# Altium footprint library PcbLibLafe.PcbLib: 297 footprints (part 11 of 19)
Each footprint in its own frame and in the unit in brackets; x right, y up, seen from the top. Pads: shape width x height; smd on the part's side, far side on the other; paste and mask are expansions set on the pad; w line width, h text height; cw(c..) or ccw(c..) is an arc to the next point about the centre after c.
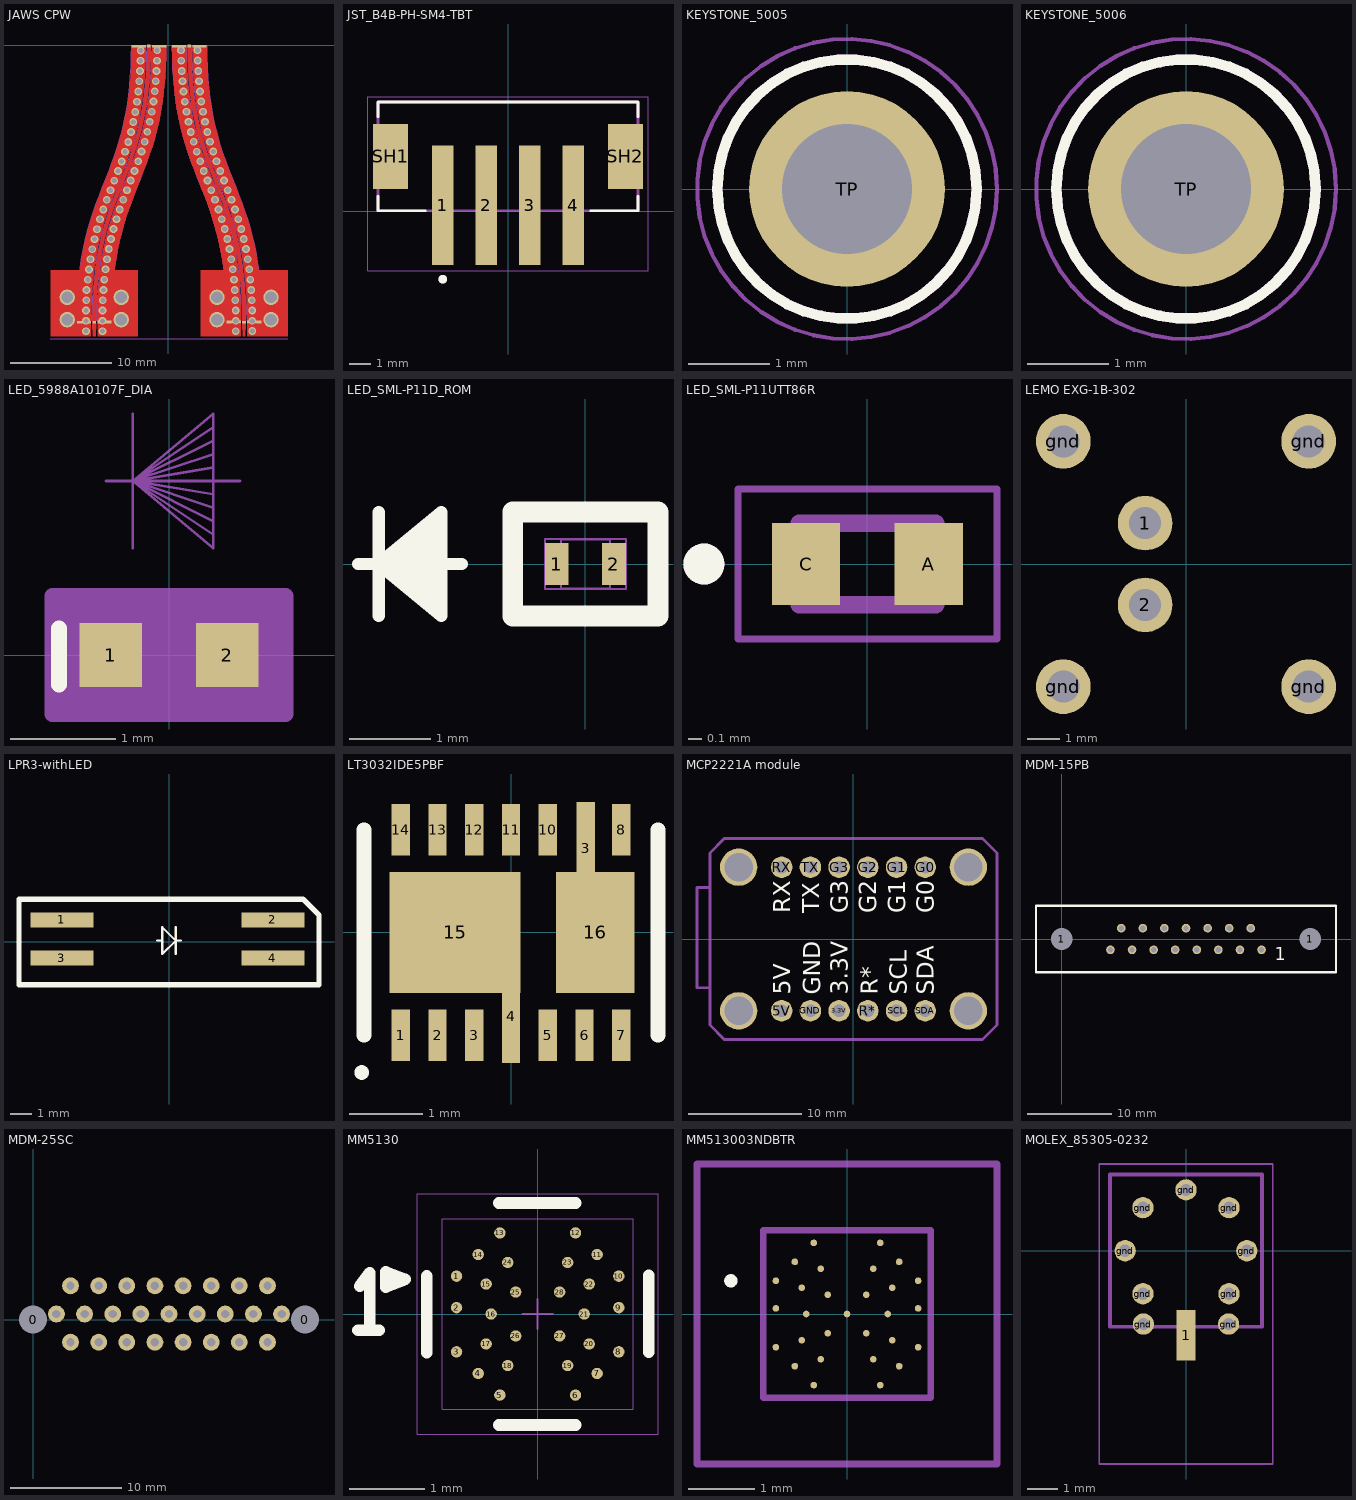
[diagram p10: the footprints below, top view; thin cyan lines are the x and y axes]

## JAWS CPW [mil]
pads (20):
  rect 55.5x10 smd paste+0 mask+0: 19(-327.75,-1075.5)
  rect 14x10 smd: 19(-288,-1075.5)
  rect 55.5x10 smd mask+0: 19(-248.25,-1075) 19(-115.25,-3) 19(-35.75,-3) 19(41.75,-3) 19(121.25,-3) 19(254.25,-1075) 19(333.75,-1075)
  rect 14x10 smd mask+0: 19(-75.5,-2.5) 19(81.5,-2.5) 19(294,-1075.5)
  round 60 hole 45 paste-99999 mask+0: SMA1-1(-393,-979) SMA1-1(189,-979) SMA1-2(-183,-979) SMA1-2(399,-979) SMA1-3(-393,-1066) SMA1-3(189,-1066) SMA1-4(-183,-1066) SMA1-4(399,-1066)
via 113.5,-19.25 diameter 30 hole 20
via 116.25,-99.25 diameter 30 hole 20
via 50.25,-59.25 diameter 30 hole 20
via 114.5,-59 diameter 30 hole 20
via 49.5,-19.25 diameter 30 hole 20
via -43.5,-19.25 diameter 30 hole 20
via -52.75,-178.75 diameter 30 hole 20
via -49,-139 diameter 30 hole 20
via -46.25,-99.25 diameter 30 hole 20
via -44.5,-59.25 diameter 30 hole 20
via -107.5,-19.75 diameter 30 hole 20
via -108.5,-59.75 diameter 30 hole 20
via -110.25,-99.75 diameter 30 hole 20
via -113,-139.5 diameter 30 hole 20
via -117,-179.5 diameter 30 hole 20
via 293,-752.5 diameter 30 hole 20
via 318.75,-910.25 diameter 30 hole 20
via 254.75,-910.25 diameter 30 hole 20
via 314.25,-870.5 diameter 30 hole 20
via 308.5,-831 diameter 30 hole 20
via 301.5,-791.5 diameter 30 hole 20
via 219,-713.75 diameter 30 hole 20
via 250.25,-870.5 diameter 30 hole 20
via 244.5,-831 diameter 30 hole 20
via 237.25,-791.5 diameter 30 hole 20
via 229,-752.5 diameter 30 hole 20
via 283,-713.75 diameter 30 hole 20
via 271.5,-675.25 diameter 30 hole 20
via 207.5,-675.25 diameter 30 hole 20
via 195,-637.5 diameter 30 hole 20
via 259,-637.5 diameter 30 hole 20
via 245.25,-599.75 diameter 30 hole 20
via 181.25,-599.75 diameter 30 hole 20
via 258,-950.5 diameter 30 hole 20
via 166.75,-562.5 diameter 30 hole 20
via 152,-525.25 diameter 30 hole 20
via 230.75,-562.5 diameter 30 hole 20
via 216.25,-525.25 diameter 30 hole 20
via 201.5,-488.25 diameter 30 hole 20
via 137.5,-488.25 diameter 30 hole 20
via 123.5,-450.5 diameter 30 hole 20
via 187.5,-450.5 diameter 30 hole 20
via 174.25,-412.75 diameter 30 hole 20
via 110.25,-413 diameter 30 hole 20
via 98.25,-374.75 diameter 30 hole 20
via 162,-374.75 diameter 30 hole 20
via 151.5,-336.25 diameter 30 hole 20
via 134.5,-258 diameter 30 hole 20
via 87.5,-336.25 diameter 30 hole 20
via 78.25,-297.25 diameter 30 hole 20
via 142.25,-297.25 diameter 30 hole 20
via 70.5,-258 diameter 30 hole 20
via 64,-218.75 diameter 30 hole 20
via 128,-218.5 diameter 30 hole 20
via 122.75,-179 diameter 30 hole 20
via 58.75,-179 diameter 30 hole 20
via 55,-139 diameter 30 hole 20
via 119,-139 diameter 30 hole 20
via 52.25,-99.25 diameter 30 hole 20
via -201.5,-675.25 diameter 30 hole 20
via -231.25,-791.5 diameter 30 hole 20
via -223,-752.5 diameter 30 hole 20
via -213,-713.75 diameter 30 hole 20
via -265.5,-675.75 diameter 30 hole 20
via -277,-714.25 diameter 30 hole 20
via -287,-753 diameter 30 hole 20
via -295.5,-792 diameter 30 hole 20
via -58,-218.5 diameter 30 hole 20
via -81.5,-336 diameter 30 hole 20
via -72.25,-297.25 diameter 30 hole 20
via -64.5,-258 diameter 30 hole 20
via -122,-219 diameter 30 hole 20
via -128.5,-258.5 diameter 30 hole 20
via -136.25,-297.75 diameter 30 hole 20
via -145.5,-336.75 diameter 30 hole 20
via -189,-637.5 diameter 30 hole 20
via -146,-525.25 diameter 30 hole 20
via -175.25,-599.75 diameter 30 hole 20
via -161,-562.5 diameter 30 hole 20
via -131.5,-488.25 diameter 30 hole 20
via -117.5,-450.75 diameter 30 hole 20
via -104.25,-412.75 diameter 30 hole 20
via -92.25,-374.75 diameter 30 hole 20
via -156.25,-375.25 diameter 30 hole 20
via -168.25,-413.25 diameter 30 hole 20
via -181.5,-451.25 diameter 30 hole 20
via -195.5,-488.5 diameter 30 hole 20
via -210,-525.75 diameter 30 hole 20
via -224.75,-563 diameter 30 hole 20
via -239.25,-600.25 diameter 30 hole 20
via -253,-638 diameter 30 hole 20
via -238.5,-831 diameter 30 hole 20
via -248.75,-910.25 diameter 30 hole 20
via -244.25,-870.5 diameter 30 hole 20
via -302.5,-831.25 diameter 30 hole 20
via -308.25,-871 diameter 30 hole 20
via -312.75,-910.75 diameter 30 hole 20
via -256,-1110.5 diameter 30 hole 20
via -320,-1110.5 diameter 30 hole 20
via -320,-1070.5 diameter 30 hole 20
via -318.5,-990.5 diameter 30 hole 20
via -320,-1030.5 diameter 30 hole 20
via -318,-950.5 diameter 30 hole 20
via -256,-1070.5 diameter 30 hole 20
via -256,-1030.5 diameter 30 hole 20
via -254.5,-990.5 diameter 30 hole 20
via -252,-950.5 diameter 30 hole 20
via 262,-1110.5 diameter 30 hole 20
via 326,-1110 diameter 30 hole 20
via 322,-950.5 diameter 30 hole 20
via 324.5,-990.5 diameter 30 hole 20
via 325.5,-1030.5 diameter 30 hole 20
via 326,-1070.5 diameter 30 hole 20
via 261.5,-1030.5 diameter 30 hole 20
via 260,-990.5 diameter 30 hole 20
via 262,-1070.5 diameter 30 hole 20
Top Layer:
  rectangle: 306,-1130.5 361.5,-1080
  rectangle: 226.5,-1130.5 282,-1080
  rectangle: -355.5,-1130.5 -300,-1069.15
  rectangle: -276,-1130.5 -220.5,-1065.5
  region: 69.52,-5 69.98,-44.67 71.55,-87.75 71.55,-87.76 74.07,-128.41 77.5,-166.79 80.47,-192 25.08,-192 22.11,-166.78 18.68,-128.4 16.15,-87.75 14.59,-44.67 14.12,-5
  region: -65.68,-143 -13.98,-143 -13.67,-139.32 -15.28,-158.51 -19.12,-193.26 -23.67,-226.23 -28.86,-257.57 -32.22,-274.5 -87.61,-274.5 -84.26,-257.59 -79.06,-226.25 -74.51,-193.27 -70.67,-158.52 -69.06,-139.32
  region: -8.09,-2.61 -8.53,-42.22 -9.93,-83.13 -12.2,-121.84 -13.98,-143 -65.68,-143 -69.06,-139.32 -67.59,-121.85 -65.32,-83.13 -63.92,-42.23 -63.45,0.95 -11.61,0.95
  region: 88.93,-45.17 88.93,-45.18 90.49,-88.26 93.02,-128.91 96.45,-167.29 96.45,-167.3 100.71,-203.57 105.75,-237.9 112.59,-276.08 112.6,-276.08 120.32,-312.04 128.82,-346.05 137.98,-378.37 149.63,-415.01 161.89,-450.07 161.9,-450.07 174.61,-484 187.6,-517.25 200.68,-550.25 213.68,-583.47 224.63,-612.43 235.27,-642.15 245.5,-672.92 255.21,-704.99 264.28,-738.67 272.61,-774.23 280.08,-811.94 285.28,-843.27 289.83,-876.25 293.67,-911 296.75,-947.66 299.01,-986.38 300.41,-1027.28 300.85,-1066.84 297.34,-1070.39 287.11,-1070.39 286.63,-1027.27 285.23,-986.37 282.96,-947.65 279.88,-910.98 279.88,-910.97 276.04,-876.22 271.49,-843.24 266.3,-811.91 266.3,-811.9 258.82,-774.18 250.49,-738.62 241.42,-704.94 241.42,-704.93 231.71,-672.85 221.48,-642.08 221.47,-642.08 210.83,-612.36 199.88,-583.39 186.88,-550.18 173.8,-517.17 160.81,-483.92 148.1,-450 135.83,-414.94 124.19,-378.31 115.03,-345.99 106.53,-311.99 98.81,-276.04 91.97,-237.87 86.93,-203.54 82.66,-167.27 79.24,-128.89 76.71,-88.25 75.14,-45.17 74.65,-3.16 78.17,0.39 88.39,0.39
  region: 189.37,-345.53 189.37,-345.54 198.54,-377.85 210.18,-414.49 222.45,-449.55 235.16,-483.48 248.15,-516.73 252.81,-528.48 197.42,-528.48 192.75,-516.69 179.76,-483.44 167.05,-449.52 154.78,-414.46 143.18,-377.95 185.25,-377.95 185.25,-329.05 184.79,-327.23
  region: 161.27,-203.06 166.31,-237.39 173.15,-275.57 180.87,-311.53 185.25,-329.05 185.25,-377.95 143.18,-377.95 143.14,-377.82 133.97,-345.51 125.48,-311.5 117.75,-275.55 110.91,-237.37 105.88,-203.05 104.58,-192 159.97,-192 158.17,-176.7
  region: 149.02,-5 149.48,-44.67 151.05,-87.75 151.05,-87.76 153.57,-128.41 157,-166.79 159.97,-192 104.58,-192 101.61,-166.78 98.18,-128.4 95.65,-87.75 94.09,-44.67 93.62,-5
  region: 81.77,-203.06 86.81,-237.39 93.65,-275.57 101.37,-311.53 109.87,-345.53 109.87,-345.54 119.04,-377.85 119.07,-377.95 63.68,-377.95 63.64,-377.82 54.47,-345.51 45.98,-311.5 38.25,-275.55 31.41,-237.37 26.38,-203.05 25.08,-192 80.47,-192 78.67,-176.7
  region: -68.65,-3.16 -69.09,-42.72 -70.49,-83.62 -72.75,-122.34 -75.83,-159 -79.67,-193.75 -84.22,-226.73 -89.42,-258.06 -96.89,-295.77 -105.22,-331.33 -114.29,-365.01 -124,-397.08 -134.23,-427.85 -144.87,-457.57 -155.82,-486.53 -168.82,-519.75 -181.9,-552.75 -194.89,-586 -207.6,-619.93 -207.61,-619.93 -219.87,-654.99 -231.52,-691.63 -240.68,-723.95 -249.18,-757.96 -256.9,-793.92 -263.75,-832.1 -268.79,-866.43 -273.05,-902.7 -273.05,-902.71 -276.48,-941.09 -279.01,-981.74 -280.57,-1024.82 -280.57,-1024.83 -281.11,-1070.39 -291.33,-1070.39 -294.85,-1066.84 -294.36,-1024.83 -292.79,-981.75 -290.26,-941.11 -286.84,-902.73 -282.57,-866.46 -277.53,-832.13 -270.69,-793.96 -262.97,-758.01 -254.47,-724.01 -245.31,-691.69 -233.67,-655.06 -221.4,-620 -208.69,-586.08 -195.7,-552.83 -182.62,-519.82 -169.62,-486.61 -158.67,-457.64 -148.03,-427.92 -148.02,-427.92 -137.79,-397.15 -128.08,-365.07 -128.08,-365.06 -119.01,-331.38 -110.68,-295.82 -103.2,-258.1 -103.2,-258.09 -98.01,-226.76 -93.46,-193.78 -89.62,-159.03 -89.62,-159.02 -86.54,-122.35 -84.27,-83.63 -82.87,-42.73 -82.39,0.39 -72.16,0.39
  region: -115.84,-295.78 -124.16,-331.34 -133.24,-365.02 -142.95,-397.1 -153.18,-427.86 -163.82,-457.59 -174.77,-486.55 -177.54,-493.63 -232.92,-493.63 -230.17,-486.59 -219.22,-457.63 -219.22,-457.62 -208.58,-427.9 -198.34,-397.14 -198.34,-397.13 -188.63,-365.05 -179.56,-331.37 -171.23,-295.81 -167.01,-274.5 -111.62,-274.5 -111,-271.38
  region: -91.7,-122.34 -94.78,-159.01 -98.62,-193.76 -103.17,-226.73 -108.36,-258.07 -111.62,-274.5 -167.01,-274.5 -163.76,-258.09 -158.56,-226.75 -154.01,-193.77 -150.17,-159.02 -148.52,-139.32 -145.13,-143 -93.44,-143 -91.7,-122.34 -91.04,-111
  region: -87.59,-3.11 -88.03,-42.72 -89.43,-83.63 -91.7,-122.34 -93.44,-143 -145.13,-143 -148.52,-139.32 -147.09,-122.35 -144.82,-83.63 -143.42,-42.73 -142.95,0.45 -91.11,0.45
  region: 130.68,-414.49 142.95,-449.55 155.66,-483.48 168.65,-516.73 173.31,-528.48 117.92,-528.48 113.25,-516.69 100.26,-483.44 87.55,-449.52 75.28,-414.46 63.68,-377.95 119.07,-377.95
  region: -36.34,-295.28 -44.66,-330.84 -53.74,-364.52 -63.45,-396.6 -73.68,-427.36 -84.32,-457.09 -95.27,-486.05 -98.23,-493.63 -153.62,-493.63 -150.67,-486.09 -139.72,-457.13 -139.72,-457.12 -129.08,-427.4 -118.84,-396.64 -118.84,-396.63 -109.13,-364.55 -100.06,-330.87 -91.73,-295.31 -87.61,-274.5 -86.99,-271.38 -87.61,-274.5 -32.22,-274.5 -31.6,-271.38
  region: 324.84,-738.16 333.16,-773.72 340.64,-811.43 345.83,-842.77 350.38,-875.74 354.22,-910.49 357.3,-947.16 359.57,-985.87 360.97,-1026.78 361.45,-1069.95 306.05,-1069.95 305.58,-1026.77 304.18,-985.87 301.91,-947.15 298.83,-910.48 294.99,-875.73 290.44,-842.75 285.24,-811.41 277.77,-773.69 269.44,-738.13 265.96,-725.23 321.35,-725.23
  region: 245.34,-738.16 253.66,-773.72 261.14,-811.43 266.33,-842.77 270.88,-875.74 274.72,-910.49 277.8,-947.16 280.07,-985.87 281.47,-1026.78 281.95,-1069.95 226.55,-1069.95 226.08,-1026.77 224.68,-985.87 222.41,-947.15 219.33,-910.48 215.49,-875.73 210.94,-842.75 205.74,-811.41 198.27,-773.69 189.94,-738.13 186.46,-725.23 241.85,-725.23
  region: 261.23,-549.74 274.23,-582.95 285.18,-611.91 295.82,-641.64 306.05,-672.4 315.76,-704.48 321.35,-725.23 265.96,-725.23 260.37,-704.45 250.66,-672.37 250.66,-672.36 240.42,-641.6 229.78,-611.88 229.78,-611.87 218.83,-582.91 205.83,-549.7 197.42,-528.48 252.81,-528.48 251.02,-523.98
  region: 181.73,-549.74 194.73,-582.95 205.68,-611.91 216.32,-641.64 226.55,-672.4 236.26,-704.48 241.85,-725.23 186.46,-725.23 180.87,-704.45 171.16,-672.37 171.16,-672.36 160.92,-641.6 150.28,-611.88 150.28,-611.87 139.33,-582.91 126.33,-549.7 118,-528.68 118.01,-528.48 173.31,-528.48
  region: 125.34,-874.75 242.49,-874.75 242.44,-1130.5 125.34,-1130.5
  region: -180.13,-723.46 -180.13,-723.47 -188.63,-757.47 -196.35,-793.43 -203.19,-831.61 -208.23,-865.94 -212.5,-902.21 -215.05,-930.82 -270.44,-930.82 -267.89,-902.22 -263.62,-865.95 -258.59,-831.63 -251.75,-793.45 -244.02,-757.5 -235.53,-723.49 -231.29,-708.57 -232.1,-711.4 -176.71,-711.4 -175.91,-708.57
  region: -259.63,-723.96 -259.63,-723.97 -268.13,-757.97 -275.85,-793.93 -282.69,-832.11 -287.73,-866.44 -292,-902.71 -294.51,-930.82 -349.9,-930.82 -347.39,-902.72 -343.12,-866.45 -338.09,-832.13 -331.25,-793.95 -323.52,-758 -315.03,-723.99 -310.65,-708.57 -311.45,-711.4 -256.07,-711.4 -255.27,-708.57
  region: -108.27,-519.26 -121.35,-552.27 -134.34,-585.52 -147.05,-619.45 -159.32,-654.51 -170.96,-691.15 -176.71,-711.4 -232.1,-711.4 -226.36,-691.18 -214.72,-654.54 -202.45,-619.48 -189.74,-585.56 -176.75,-552.31 -163.67,-519.3 -153.62,-493.63 -98.23,-493.63 -97.12,-490.78
  region: -187.77,-519.76 -200.85,-552.77 -213.84,-586.02 -226.55,-619.95 -238.82,-655.01 -250.46,-691.65 -256.07,-711.4 -311.45,-711.4 -305.86,-691.68 -294.22,-655.04 -281.95,-619.98 -269.24,-586.06 -256.25,-552.81 -243.17,-519.8 -232.92,-493.63 -177.54,-493.63
  region: 345.99,-874.75 463.14,-874.75 463.14,-1130.5 345.94,-1130.5
  region: 301,-1080.5 299.48,-1130.5 288.52,-1130.5 287,-1080.5
  region: -215.93,-940.59 -218.45,-981.24 -218.45,-981.25 -220.02,-1024.33 -220.55,-1069.95 -272.39,-1069.95 -275.9,-1066.39 -275.41,-1024.33 -273.85,-981.25 -271.32,-940.6 -270.44,-930.82 -215.05,-930.82 -212.5,-902.21
  region: -295.43,-941.09 -297.95,-981.74 -297.95,-981.75 -299.52,-1024.83 -299.59,-1030.96 -300.05,-1070.45 -351.89,-1070.45 -355.4,-1066.89 -354.91,-1024.83 -353.35,-981.75 -350.82,-941.1 -349.9,-930.82 -294.51,-930.82 -292,-902.71
  region: -282.5,-1130.5 -293.5,-1130.5 -295,-1080.5 -281,-1080.5
  region: -456.66,-874.75 -339.51,-874.75 -339.56,-1130.5 -456.66,-1130.5
  region: -236.01,-874.75 -118.86,-874.75 -118.86,-1130.5 -236.06,-1130.5
  lines w1: -354.91,-1074.2 -354.91,-1066.05 ; -354.37,-1074.36 -354.37,-1066.21 ; -353.55,-1074.43 -353.55,-1066.28 ; -353.01,-1074.5 -353.01,-1066.35 ; -352.18,-1074.71 -352.18,-1066.56 ; -294.4,-1071.58 -294.4,-1066.77 ; -293.5,-1077 -292.57,-1083.35 -293.16,-1075.9 ; -293.47,-1067.05 -293.47,-1071.86 -293.16,-1075.9 ; -292.85,-1072.03 -292.85,-1067.22 ; -292.2,-1072.31 -292.2,-1067.49 ; -291.44,-1072.62 -291.44,-1067.8 ; -291.03,-1072.89 -291.03,-1070.59 ; -291.03,-1068.08 -291.03,-1070.59 ; -281.51,-1070.52 -288.04,-1070.57 -291.03,-1070.59 ; 287.57,-1070.47 294,-1070.46 ; 297.33,-1072.35 297.33,-1070.46 ; 297.33,-1067.54 297.33,-1070.46 ; 297.52,-1070.46 297.33,-1070.46 ; 297.81,-1071.97 297.81,-1067.15 ; 298.37,-1071.75 298.37,-1066.94 ; 299.04,-1071.64 299.04,-1066.83 ; 299.64,-1071.53 299.64,-1066.72 ; 300.34,-1071.46 300.34,-1066.64 ; -293.16,-1075.9 -293.16,-1075.9 ; -291.06,-1070.59 -291.03,-1070.59 ; 294,-1070.46 294,-1070.46 ; 294,-1070.46 297.33,-1070.46
Mid-Layer 1:
  rectangle: -458.12,-1130.5 -119,-873.72
  rectangle: 124,-1130.5 463.12,-874.72
  region: 149.05,-3.5 14.05,-3.5 14.08,-6 14.11,-9 14.22,-19 14.48,-42.23 15.02,-58 15.88,-83.13 17.28,-107 18.15,-121.85 19.17,-134 20.18,-146 21.23,-158.51 22.39,-169 23.5,-179 25.07,-193.27 27.37,-210 28.61,-219 29.61,-226.24 30.57,-232 31.4,-237 32.39,-243 34.81,-257.58 37.07,-269 40.5,-286.3 42.28,-295.3 44.5,-304.76 48.77,-323 50.61,-330.86 52.5,-337.87 54.5,-345 56.85,-354 59.69,-364.54 69.4,-396.62 73.85,-410 79.63,-427.38 82.71,-436 87.01,-448 90.27,-457.11 94.39,-468 99.68,-482 105.1,-496 120.76,-535.79 126,-549 135.39,-573 140.29,-585.54 144.96,-598 153,-619.47 164.74,-653 170.5,-671 175.27,-686 176.91,-691.16 179.14,-699 180.27,-703 183.11,-713 186.08,-723.48 188.46,-733 193.96,-755 196.19,-765 199.2,-779 202.3,-793.44 204.5,-805.73 205.27,-810 207.06,-820 209.14,-831.62 212.13,-852 214.18,-865.94 215.13,-874 217.5,-894.19 219.05,-909 221.5,-936.43 221.87,-940.6 222.33,-948 223.02,-959 223.76,-971 224.4,-981.25 224.65,-988 225.5,-1011.53 226.04,-1031 226.18,-1043 226.43,-1064 226.5,-1070 361.5,-1070 361.37,-1059 361.15,-1040 360.81,-1020 360.01,-998 359.4,-981.25 358.83,-972 358.14,-961 356.87,-940.6 355.21,-922 353.87,-907 351.42,-885 349.18,-865.94 344.14,-831.62 340.5,-811.31 337.3,-793.44 335.27,-784 333.12,-774 329.58,-757.48 326.96,-747 321.08,-723.48 318.5,-714.38 317.26,-710 311.91,-691.16 309.5,-683.57 306.14,-673 300.27,-654.53 292.5,-632.32 288,-619.47 281.83,-603 275.29,-585.54 266.09,-562 249.22,-519.28 236.22,-486.07 228.63,-466 222.73,-450 214.63,-427.38 207.5,-406 204.4,-396.62 199.06,-379 194.69,-364.54 185.61,-330.86 177.68,-297 169.81,-257.58 164.61,-226.24 160.07,-193.27 156.23,-158.51 155.01,-144 153.15,-121.85 151.98,-102 150.57,-74 149.48,-42.23
  region: -142.94,-3 -7.94,-3 -8.08,-15 -8.11,-18 -8.22,-28 -8.48,-51.23 -9.02,-67 -9.88,-92.13 -11.28,-116 -12.15,-130.85 -13.17,-143 -14.18,-155 -15.23,-167.51 -16.39,-178 -17.5,-188 -19.07,-202.27 -21.37,-219 -22.61,-228 -23.61,-235.24 -24.57,-241 -25.4,-246 -26.39,-252 -28.81,-266.58 -31.07,-278 -34.5,-295.3 -36.28,-304.3 -38.5,-313.76 -42.77,-332 -44.61,-339.86 -46.5,-346.87 -48.5,-354 -50.85,-363 -53.69,-373.54 -63.4,-405.62 -67.85,-419 -73.63,-436.38 -76.71,-445 -81.01,-457 -84.27,-466.11 -88.39,-477 -93.68,-491 -99.1,-505 -114.76,-544.79 -120,-558 -129.39,-582 -134.29,-594.54 -138.96,-607 -147,-628.47 -158.74,-662 -164.5,-680 -169.27,-695 -170.91,-700.16 -173.14,-708 -174.27,-712 -177.11,-722 -180.08,-732.48 -182.46,-742 -187.96,-764 -190.19,-774 -193.2,-788 -196.3,-802.44 -198.5,-814.73 -199.27,-819 -201.06,-829 -203.14,-840.62 -206.13,-861 -208.18,-874.94 -209.13,-883 -211.5,-903.19 -213.05,-918 -215.5,-945.43 -215.87,-949.6 -216.33,-957 -217.02,-968 -217.76,-980 -218.4,-990.25 -218.65,-997 -219.5,-1020.53 -220.04,-1040 -220.18,-1052 -220.43,-1073 -220.5,-1079 -355.5,-1079 -355.37,-1068 -355.15,-1049 -354.81,-1029 -354.01,-1007 -353.4,-990.25 -352.83,-981 -352.14,-970 -350.87,-949.6 -349.21,-931 -347.87,-916 -345.42,-894 -343.18,-874.94 -338.14,-840.62 -334.5,-820.31 -331.3,-802.44 -329.27,-793 -327.12,-783 -323.58,-766.48 -320.96,-756 -315.08,-732.48 -312.5,-723.38 -311.26,-719 -305.91,-700.16 -303.5,-692.57 -300.14,-682 -294.27,-663.53 -286.5,-641.32 -282,-628.47 -275.83,-612 -269.29,-594.54 -260.09,-571 -243.22,-528.28 -230.22,-495.07 -222.63,-475 -216.73,-459 -208.63,-436.38 -201.5,-415 -198.4,-405.62 -193.06,-388 -188.69,-373.54 -179.61,-339.86 -171.68,-306 -163.81,-266.58 -158.61,-235.24 -154.07,-202.27 -150.23,-167.51 -149.01,-153 -147.15,-130.85 -145.98,-111 -144.57,-83 -143.48,-51.23
Top Solder:
  drawing of 134 lines, arcs and shapes, not listed
Mechanical 2:
  lines w1: -458,-1141 463,-1141
Mechanical 3:
  drawing of 240 lines, arcs and shapes, not listed
Mechanical 4:
  drawing of 278 lines, arcs and shapes, not listed

## JST_B4B-PH-SM4-TBT [mm]
height 6.6
pads (6):
  rect 1x5.5 smd: 1(-3,0.265) 2(-1,0.265) 3(1,0.265) 4(3,0.265)
  rect 1.6x3 smd: SH1(-5.4,2.515) SH2(5.4,2.515)
Top Overlay:
  circle w0.2: c-3,-3.135 r0.1
  lines w0.127: -5.975,0.695 -5.975,0.015 -3.82,0.015 ; -5.975,4.335 -5.975,5.015 5.975,5.015 5.975,4.335 ; 3.82,0.015 5.975,0.015 5.975,0.695
Mechanical 13:
  circle w0.2: c-3,-3.135 r0.1
  lines w0.127: -5.975,0.015 5.975,0.015 5.975,5.015 -5.975,5.015 -5.975,0.015
Mechanical 15:
  lines w0.05: -6.45,-2.735 -6.45,5.265 6.45,5.265 6.45,-2.735 -6.45,-2.735

## KEYSTONE_5005 [mm]
pads (1):
  round 2.4 hole 1.6: TP(0,0)
Top Overlay:
  circle w0.127: c0,0 r1.59
Mechanical 13:
  circle w0.127: c0,0 r1.59
Mechanical 15:
  circle w0.05: c0,0 r1.84
3D body "step_temp.STEP": height 5.58, standoff -3.3, extent -1.576,-1.587 1.576,1.587

## KEYSTONE_5006 [mm]
pads (1):
  round 2.4 hole 1.6: TP(0,0)
Top Overlay:
  circle w0.127: c0,0 r1.59
Mechanical 13:
  circle w0.127: c0,0 r1.59
Mechanical 15:
  circle w0.05: c0,0 r1.84
3D body "step_temp.STEP": height 5.58, standoff -3.3, extent -1.576,-1.587 1.576,1.587

## LED_5988A10107F_DIA [mil]
pads (2):
  rect 23.5x24 smd paste+0 mask+0: 1(-21.75,0) 2(21.75,0)
Top Overlay:
  lines w6: -41,-11 -41,10
Mechanical 13:
  lines w1: -23.5,65 26.5,65 ; -13.5,40 -13.5,90 ; 16.5,45 -13.5,65 ; 16.5,50 -13.5,65 ; 16.5,55 -13.5,65 ; 16.5,60 -13.5,65 ; 16.5,70 -13.5,65 ; 16.5,75 -13.5,65 ; 16.5,80 -13.5,65 ; 16.5,85 -13.5,65 ; -13.5,65 16.5,40 16.5,90 -13.5,65 ; -19.5,-10 -19.5,10 19.5,10 19.5,-10 -19.5,-10
Mechanical 15:
  region: -29.5,-22 -43.5,-22 -43.5,22 -29.5,22 29.5,22 43.5,22 43.5,-22 29.5,-22
  lines w6: -43.5,-22 -29.5,-22 29.5,-22 43.5,-22 43.5,22 29.5,22 -29.5,22 -43.5,22 -43.5,-22
3D body "LED_5988A10107F_DIA.step": height 16.1, standoff -0.12, extent -19.49,-10.12 19.49,10.12

## LED_SML-P11D_ROM [mil]
pads (2):
  rect 11.5x20 smd paste+0 mask+0: 1(-13.75,0) 2(13.75,0)
Top Overlay:
  lines w6: -109.5,0 -59.5,0 ; -99.5,-25 -99.5,25 ; -69.5,-20 -99.5,0 ; -69.5,-15 -99.5,0 ; -69.5,-10 -99.5,0 ; -69.5,-5 -99.5,0 ; -69.5,5 -99.5,0 ; -69.5,10 -99.5,0 ; -69.5,15 -99.5,0 ; -69.5,20 -99.5,0 ; -99.5,0 -69.5,-25 -69.5,25 -99.5,0
  lines w10: -35,-25 35,-25 35,25 -35,25 -35,-25
Mechanical 13:
  lines w1: -109.5,0 -59.5,0 ; -99.5,-25 -99.5,25 ; -69.5,-20 -99.5,0 ; -69.5,-15 -99.5,0 ; -69.5,-10 -99.5,0 ; -69.5,-5 -99.5,0 ; -69.5,5 -99.5,0 ; -69.5,10 -99.5,0 ; -69.5,15 -99.5,0 ; -69.5,20 -99.5,0 ; -99.5,0 -69.5,-25 -69.5,25 -99.5,0 ; -19.5,-12 -19.5,12 19.5,12 19.5,-12 -19.5,-12 ; -11.81,-11.81 11.81,-11.81 11.81,11.81 -11.81,11.81 -11.81,-11.81
3D body: height 10, standoff 0, extent 0,0 10,10

## LED_SML-P11UTT86R [mm]
pads (2):
  rect 0.5x0.6 smd: A(0.45,0) C(-0.45,0)
Top Overlay:
  circle w0.2: c-1.2,0 r0.05
Mechanical 13:
  circle w0.2: c-1.2,0 r0.05
  lines w0.127: -0.5,-0.3 -0.5,0.3 0.5,0.3 0.5,-0.3 -0.5,-0.3
Mechanical 15:
  lines w0.05: -0.95,-0.55 -0.95,0.55 0.95,0.55 0.95,-0.55 -0.95,-0.55
3D body "step_temp.STEP": height 0.21, standoff -0.04, extent -0.5,-0.3 0.5,0.3

## LEMO EXG-1B-302 [mm] "2 pin LEMO right angle panel mount"
pads (6):
  round 1.7 hole 1: 1(-1.27,1.27) 2(-1.27,-1.27) gnd(-3.81,-3.81) gnd(-3.81,3.81) gnd(3.81,-3.81) gnd(3.81,3.81)

## LPR3-withLED [mil] "Bivar lightpipe integrated LED"
pads (4):
  rect 118x28 smd: 1(-200,41) 2(194,41) 3(-200,-30) 4(194,-30)
Top Overlay:
  lines w4: 12.5,-22.5 12.5,2.5 ; 12.5,27.5 12.5,2.5 ; 22.5,2.5 12.5,2.5 ; -12.5,2.5 -12.5,-22.5 12.5,2.5 ; -12.5,2.5 -22.5,2.5 -12.5,2.5 ; -12.5,2.5 -12.5,27.5 12.5,2.5
  lines w10: -280,-80 280,-80 280,50 250,80 -280,80 -280,-80

## LT3032IDE5PBF [mm]
pads (16):
  rect 0.25x0.7 smd: 1(-1.5,-1.4) 2(-1,-1.4) 3(-0.5,-1.4) 5(0.5,-1.4) 6(1,-1.4) 7(1.5,-1.4) 8(1.5,1.4) 10(0.5,1.4) 11(0,1.4) 12(-0.5,1.4) 13(-1,1.4) 14(-1.5,1.4)
  rect 0.25x1.27 smd: 3(1.016,1.143) 4(0,-1.143)
  rect 1.78x1.65 smd: 15(-0.762,0)
  rect 1.07x1.65 smd: 16(1.145,0)
Top Overlay:
  lines w0.1: -2.032,-1.955 ccw(c-2.032,-1.905) -2.032,-1.855 ccw(c-2.032,-1.905) -2.032,-1.955
  lines w0.2: -2,-1.4 -2,1.4 ; 2,-1.4 2,1.4
3D body "LT3032IDE-5#PBF.stp": height 0.9, standoff 0, extent -2,-1.5 2,1.5

## MCP2221A module [mil] "Adafruit MCP2221A"
pads (16):
  round 75 hole 45: 3.3V(-50,-250) 5V(-250,-250) G0(250,250) G1(150,250) G2(50,250) G3(-50,250) GND(-150,-250) R*(50,-250) RX(-250,250) SCL(150,-250) SDA(250,-250) TX(-150,250)
  round 130 hole 100: ""(-400,-250) ""(-400,250) ""(400,-250) ""(400,250)
Top Overlay:
  text "SDA" at 280,-195 h60
  text "SCL" at 185,-195 h60
  text "R*" at 85,-195 h60
  text "3.3V" at -20,-195 h60
  text "GND" at -115,-195 h60
  text "5V" at -220,-195 h60
  text "G0" at 280,90 h60
  text "G1" at 180,90 h60
  text "G2" at 80,90 h60
  text "G3" at -20,90 h60
  text "TX" at -120,90 h60
  text "RX" at -220,90 h60
Mechanical 2:
  lines w10: -500,-170 -545,-170 -545,180 -500,180 ; -500,-300 -500,300 -450,350 450,350 500,300 500,-300 450,-350 -450,-350 -500,-300

## MDM-15PB [mil] "MicroD-15 pin"
pads (17):
  round 60 hole 100: 1(0,0) 1(1150,0)
  round 40 hole 25: ""(225,-50) ""(275,50) ""(325,-50) ""(375,50) ""(425,-50) ""(475,50) ""(525,-50) ""(575,50) ""(625,-50) ""(675,50) ""(725,-50) ""(775,50) ""(825,-50) ""(875,50) ""(925,-50)
Top Overlay:
  lines w10: -120,-154 1270,-154 1270,154 -120,154 -120,-154
  text "1" at 987,-98 h60

## MDM-25SC [mil] "MicroD 25 pin female socket"
pads (27):
  round 60 hole 100: 0(0,0) 0(966,0)
  round 60 hole 30: ""(83,20) ""(133,-80) ""(133,120) ""(183,20) ""(233,-80) ""(233,120) ""(283,20) ""(333,-80) ""(333,120) ""(383,20) ""(433,-80) ""(433,120) ""(483,20) ""(533,-80) ""(533,120) ""(583,20) ""(633,-80) ""(633,120) ""(683,20) ""(733,-80) ""(733,120) ""(783,20) ""(833,-80) ""(833,120) ""(883,20)

## MM5130 [mm] "Standard MM5130 Footprint"
height 1
pads (28):
  round 0.15 smd paste+0 mask+0.025: 1(-1.072,0.5) 2(-1.072,0.084) 3(-1.072,-0.5) 4(-0.786,-0.786) 5(-0.5,-1.072) 6(0.5,-1.072) 7(0.786,-0.786) 8(1.072,-0.5) 9(1.072,0.084) 10(1.072,0.5) 11(0.786,0.786) 12(0.5,1.072) 13(-0.5,1.072) 14(-0.786,0.786) 15(-0.681,0.396) 16(-0.615,0) 17(-0.681,-0.396) 18(-0.396,-0.681) 19(0.396,-0.681) 20(0.681,-0.396) 21(0.615,0) 22(0.681,0.396) 23(0.396,0.681) 24(-0.396,0.681) 25(-0.29,0.29) 26(-0.29,-0.29) 27(0.29,-0.29) 28(0.29,0.29)
Top Overlay:
  lines w0.152: -2.349,0.368 -2.222,0.546 -2.222,-0.216 -2.375,-0.216 -2.095,-0.216 ; -1.467,-0.514 -1.467,0.502 ; -0.514,-1.467 0.502,-1.467 ; -0.514,1.467 0.502,1.467 ; 1.467,-0.504 1.467,0.512 ; -2.007,0.356 -1.753,0.457 -2.007,0.559 -2.007,0.356
Top Courtyard:
  lines w0.01: -1.59,-1.59 1.59,-1.59 1.59,1.59 -1.59,1.59 -1.59,-1.59
Top Component Center:
  lines w0.025: -0.2,0 0.2,0 ; 0,-0.2 0,0.2
Mechanical 16:
  text "G1" at -1.16,0.162 h0.07
  text "RF1" at -0.881,0.858 h0.07
  text "G2" at -0.709,0.091 h0.07
  text "G3" at 0.764,0.097 h0.07
  text "RF4" at 0.93,0.859 h0.07
  text "G4" at 1.205,0.186 h0.07
  text "RF2" at -0.855,-1.065 h0.07
  text "RFC" at 0.027,-0.303 h0.07
  text "RF3" at 0.954,-1.016 h0.07
Top Component Outline:
  lines w0.01: -1.26,-1.26 1.26,-1.26 1.26,1.26 -1.26,1.26 -1.26,-1.26
3D body "MM5130.STEP": height 0.94, standoff 0, extent -1.26,-1.26 1.26,1.26

## MM513003NDBTR [mm]
pads (29):
  round 0.1 smd: 1(-1.072,0.5) 2(-1.072,0.084) 3(-1.072,-0.5) 4(-0.786,-0.786) 5(-0.5,-1.072) 6(0.5,-1.072) 7(0.786,-0.786) 8(1.072,-0.5) 9(1.072,0.084) 10(1.072,0.5) 11(0.786,0.786) 12(0.5,1.072) 13(-0.5,1.072) 14(-0.786,0.786) 15(-0.681,0.396) 16(-0.615,0) 17(-0.681,-0.396) 18(-0.396,-0.681) 19(0.396,-0.681) 20(0.681,-0.396) 21(0.615,0) 22(0.681,0.396) 23(0.396,0.681) 24(-0.396,0.681) 25(-0.29,0.29) 26(-0.29,-0.29) 27(0.29,-0.29) 28(0.29,0.29) 29(0,0)
Top Overlay:
  lines w0.1: -1.8,0.5 cw(c-1.75,0.5) -1.7,0.5 cw(c-1.75,0.5) -1.8,0.5
Mechanical 15:
  lines w0.1: -1.26,-1.26 -1.26,1.26 1.26,1.26 1.26,-1.26 -1.26,-1.26
Mechanical 20:
  lines w0.1: -2.26,-2.26 -2.26,2.26 2.26,2.26 2.26,-2.26 -2.26,-2.26
3D body "MM5130-03NDB-TR.stp": height 0.94, standoff 0, extent -1.26,-1.26 1.26,1.26

## MOLEX_85305-0232 [mm]
height 4.1
pads (10):
  rect 0.61x1.651 smd: 1(0,-2.775)
  round 0.7 hole 0.4 mask+0: gnd(-2,0) gnd(-1.414,-1.414) gnd(-1.414,1.414) gnd(-1.4,-2.41) gnd(0,2) gnd(1.4,-2.41) gnd(1.414,-1.414) gnd(1.414,1.414) gnd(2,0)
Top Paste:
  region: 2.6,-2.6 0.725,-2.6 0.725,-1.198 0.917,-1.058 1.086,-0.884 1.222,-0.683 1.322,-0.462 1.381,-0.227 1.4,0.015 1.376,0.256 1.312,0.49 1.208,0.708 1.067,0.906 0.895,1.077 0.696,1.215 0.476,1.317 0.242,1.379 0,1.4 -0.242,1.379 -0.476,1.317 -0.696,1.215 -0.895,1.077 -1.067,0.906 -1.208,0.708 -1.312,0.49 -1.376,0.256 -1.4,0.015 -1.381,-0.227 -1.322,-0.462 -1.222,-0.683 -1.086,-0.884 -0.917,-1.058 -0.725,-1.198 -0.725,-2.6 -2.6,-2.6 -2.6,2.6 2.6,2.6
Top Solder:
  region: 2.6,-2.6 0.725,-2.6 0.725,-1.198 0.917,-1.058 1.086,-0.884 1.222,-0.683 1.322,-0.462 1.381,-0.227 1.4,0.015 1.376,0.256 1.312,0.49 1.208,0.708 1.067,0.906 0.895,1.077 0.696,1.215 0.476,1.317 0.242,1.379 0,1.4 -0.242,1.379 -0.476,1.317 -0.696,1.215 -0.895,1.077 -1.067,0.906 -1.208,0.708 -1.312,0.49 -1.376,0.256 -1.4,0.015 -1.381,-0.227 -1.322,-0.462 -1.222,-0.683 -1.086,-0.884 -0.917,-1.058 -0.725,-1.198 -0.725,-2.6 -2.6,-2.6 -2.6,2.6 2.6,2.6
Mechanical 13:
  lines w0.127: -2.5,-2.5 -2.5,2.5 2.5,2.5 2.5,-2.5 -2.5,-2.5
Mechanical 15:
  lines w0.05: -2.85,-7.01 2.85,-7.01 2.85,2.85 -2.85,2.85 -2.85,-7.01
3D body "853050232.stp": height 4.06, standoff -0.04, extent -2.5,-3.499 2.5,2.5